# Altium footprint library 1.27插件排针.PcbLib: 49 footprints (part 3 of 4)
Each footprint in its own frame and in the unit in brackets; x right, y up, seen from the top. Pads: shape width x height; smd on the part's side, far side on the other; paste and mask are expansions set on the pad; w line width, h text height; cw(c..) or ccw(c..) is an arc to the next point about the centre after c.
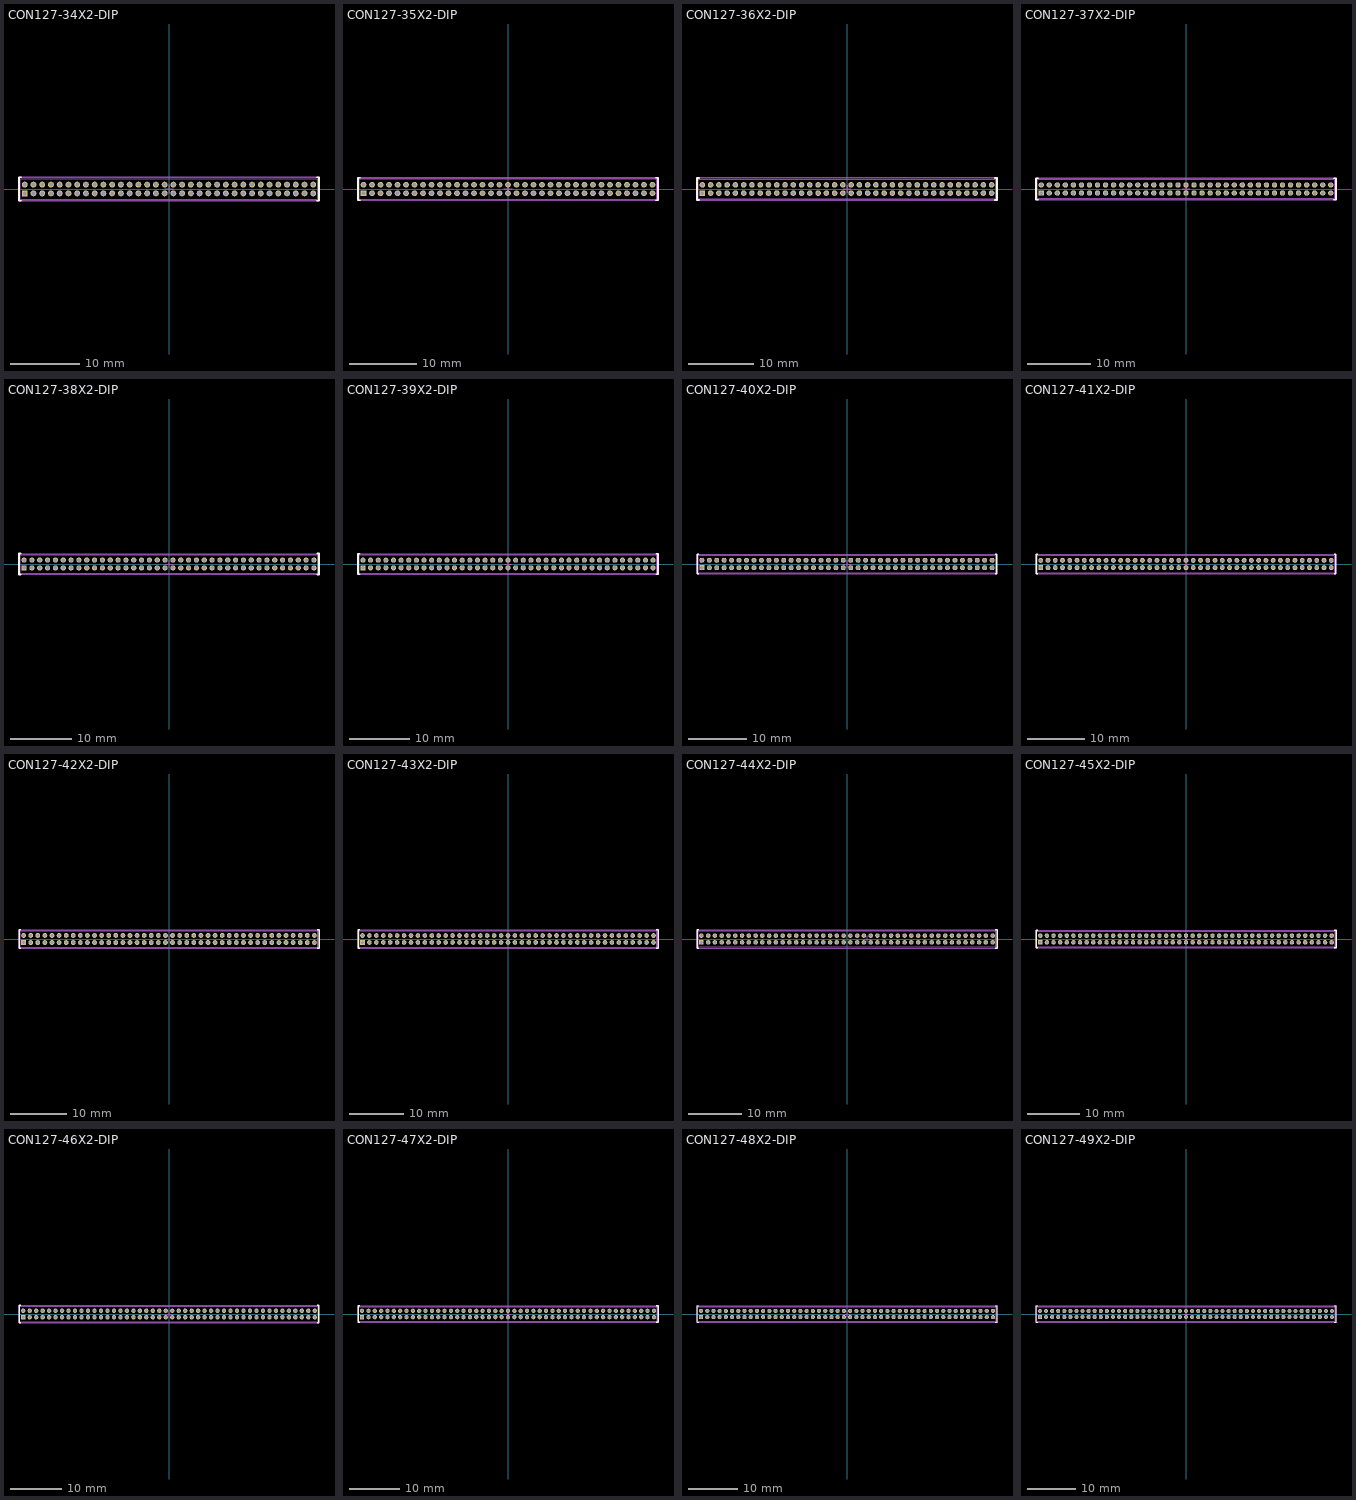
[diagram p2: the footprints below, top view; thin cyan lines are the x and y axes]

## CON127-34X2-DIP [mm] "1.27mm脚距34*2 双排针 -55°C to+105°C 450V AC"
height 3.5
pads (68):
  rect 0.85x0.85 hole 0.55 unplated: 1(-20.955,-0.635)
  round 0.85 hole 0.55 unplated: 2(-20.955,0.635) 3(-19.685,-0.635) 4(-19.685,0.635) 5(-18.415,-0.635) 6(-18.415,0.635) 7(-17.145,-0.635) 8(-17.145,0.635) 9(-15.875,-0.635) 10(-15.875,0.635) 11(-14.605,-0.635) 12(-14.605,0.635) 13(-13.335,-0.635) 14(-13.335,0.635) 15(-12.065,-0.635) 16(-12.065,0.635) 17(-10.795,-0.635) 18(-10.795,0.635) 19(-9.525,-0.635) 20(-9.525,0.635) 21(-8.255,-0.635) 22(-8.255,0.635) 23(-6.985,-0.635) 24(-6.985,0.635) 25(-5.715,-0.635) 26(-5.715,0.635) 27(-4.445,-0.635) 28(-4.445,0.635) 29(-3.175,-0.635) 30(-3.175,0.635) 31(-1.905,-0.635) 32(-1.905,0.635) 33(-0.635,-0.635) 34(-0.635,0.635) 35(0.635,-0.635) 36(0.635,0.635) 37(1.905,-0.635) 38(1.905,0.635) 39(3.175,-0.635) 40(3.175,0.635) 41(4.445,-0.635) 42(4.445,0.635) 43(5.715,-0.635) 44(5.715,0.635) 45(6.985,-0.635) 46(6.985,0.635) 47(8.255,-0.635) 48(8.255,0.635) 49(9.525,-0.635) 50(9.525,0.635) 51(10.795,-0.635) 52(10.795,0.635) 53(12.065,-0.635) 54(12.065,0.635) 55(13.335,-0.635) 56(13.335,0.635) 57(14.605,-0.635) 58(14.605,0.635) 59(15.875,-0.635) 60(15.875,0.635) 61(17.145,-0.635) 62(17.145,0.635) 63(18.415,-0.635) 64(18.415,0.635) 65(19.685,-0.635) 66(19.685,0.635) 67(20.955,-0.635) 68(20.955,0.635)
Top Overlay:
  lines w0.254: -21.463,-1.7 -21.78,-1.7 -21.78,1.7 -21.463,1.7 ; 21.463,-1.7 21.78,-1.7 21.78,1.7 21.463,1.7
Mechanical 13:
  lines w0.1: -21.59,-1.499 -21.59,1.501 ; -21.59,-1.499 21.59,-1.499 ; -21.59,-1.499 -21.59,1.501 ; -21.59,1.501 21.59,1.501 ; 21.59,-1.499 21.59,1.501 ; 21.59,-1.499 21.59,1.501
Mechanical 15:
  lines w0.2: -0.6,0 0.6,0 ; 0,-0.6 0,0.6 ; -21.78,-1.7 21.78,-1.7 21.78,1.7 -21.78,1.7 -21.78,-1.7
3D body: height 3.8, standoff -1.8, extent -21.59,-1.499 21.59,1.501

## CON127-35X2-DIP [mm] "1.27mm脚距35*2 双排针 -55°C to+105°C 450V AC"
height 3.5
pads (70):
  rect 0.85x0.85 hole 0.55 unplated: 1(-21.59,-0.635)
  round 0.85 hole 0.55 unplated: 2(-21.59,0.635) 3(-20.32,-0.635) 4(-20.32,0.635) 5(-19.05,-0.635) 6(-19.05,0.635) 7(-17.78,-0.635) 8(-17.78,0.635) 9(-16.51,-0.635) 10(-16.51,0.635) 11(-15.24,-0.635) 12(-15.24,0.635) 13(-13.97,-0.635) 14(-13.97,0.635) 15(-12.7,-0.635) 16(-12.7,0.635) 17(-11.43,-0.635) 18(-11.43,0.635) 19(-10.16,-0.635) 20(-10.16,0.635) 21(-8.89,-0.635) 22(-8.89,0.635) 23(-7.62,-0.635) 24(-7.62,0.635) 25(-6.35,-0.635) 26(-6.35,0.635) 27(-5.08,-0.635) 28(-5.08,0.635) 29(-3.81,-0.635) 30(-3.81,0.635) 31(-2.54,-0.635) 32(-2.54,0.635) 33(-1.27,-0.635) 34(-1.27,0.635) 35(0,-0.635) 36(0,0.635) 37(1.27,-0.635) 38(1.27,0.635) 39(2.54,-0.635) 40(2.54,0.635) 41(3.81,-0.635) 42(3.81,0.635) 43(5.08,-0.635) 44(5.08,0.635) 45(6.35,-0.635) 46(6.35,0.635) 47(7.62,-0.635) 48(7.62,0.635) 49(8.89,-0.635) 50(8.89,0.635) 51(10.16,-0.635) 52(10.16,0.635) 53(11.43,-0.635) 54(11.43,0.635) 55(12.7,-0.635) 56(12.7,0.635) 57(13.97,-0.635) 58(13.97,0.635) 59(15.24,-0.635) 60(15.24,0.635) 61(16.51,-0.635) 62(16.51,0.635) 63(17.78,-0.635) 64(17.78,0.635) 65(19.05,-0.635) 66(19.05,0.635) 67(20.32,-0.635) 68(20.32,0.635) 69(21.59,-0.635) 70(21.59,0.635)
Top Overlay:
  lines w0.254: -22.098,-1.7 -22.415,-1.7 -22.415,1.7 -22.098,1.7 ; 22.098,-1.7 22.415,-1.7 22.415,1.7 22.098,1.7
Mechanical 13:
  lines w0.1: -22.225,-1.499 -22.225,1.501 ; -22.225,-1.499 22.225,-1.499 ; -22.225,-1.499 -22.225,1.501 ; -22.225,1.501 22.225,1.501 ; 22.225,-1.499 22.225,1.501 ; 22.225,-1.499 22.225,1.501
Mechanical 15:
  lines w0.2: -0.6,0 0.6,0 ; 0,-0.6 0,0.6 ; -22.415,-1.7 -22.415,1.7 22.415,1.7 22.415,-1.7 -22.415,-1.7
3D body: height 3.8, standoff -1.8, extent -22.225,-1.499 22.225,1.501

## CON127-36X2-DIP [mm] "1.27mm脚距36*2 双排针 -55°C to+105°C 450V AC"
height 3.5
pads (72):
  rect 0.85x0.85 hole 0.55 unplated: 1(-22.225,-0.635)
  round 0.85 hole 0.55 unplated: 2(-22.225,0.635) 3(-20.955,-0.635) 4(-20.955,0.635) 5(-19.685,-0.635) 6(-19.685,0.635) 7(-18.415,-0.635) 8(-18.415,0.635) 9(-17.145,-0.635) 10(-17.145,0.635) 11(-15.875,-0.635) 12(-15.875,0.635) 13(-14.605,-0.635) 14(-14.605,0.635) 15(-13.335,-0.635) 16(-13.335,0.635) 17(-12.065,-0.635) 18(-12.065,0.635) 19(-10.795,-0.635) 20(-10.795,0.635) 21(-9.525,-0.635) 22(-9.525,0.635) 23(-8.255,-0.635) 24(-8.255,0.635) 25(-6.985,-0.635) 26(-6.985,0.635) 27(-5.715,-0.635) 28(-5.715,0.635) 29(-4.445,-0.635) 30(-4.445,0.635) 31(-3.175,-0.635) 32(-3.175,0.635) 33(-1.905,-0.635) 34(-1.905,0.635) 35(-0.635,-0.635) 36(-0.635,0.635) 37(0.635,-0.635) 38(0.635,0.635) 39(1.905,-0.635) 40(1.905,0.635) 41(3.175,-0.635) 42(3.175,0.635) 43(4.445,-0.635) 44(4.445,0.635) 45(5.715,-0.635) 46(5.715,0.635) 47(6.985,-0.635) 48(6.985,0.635) 49(8.255,-0.635) 50(8.255,0.635) 51(9.525,-0.635) 52(9.525,0.635) 53(10.795,-0.635) 54(10.795,0.635) 55(12.065,-0.635) 56(12.065,0.635) 57(13.335,-0.635) 58(13.335,0.635) 59(14.605,-0.635) 60(14.605,0.635) 61(15.875,-0.635) 62(15.875,0.635) 63(17.145,-0.635) 64(17.145,0.635) 65(18.415,-0.635) 66(18.415,0.635) 67(19.685,-0.635) 68(19.685,0.635) 69(20.955,-0.635) 70(20.955,0.635) 71(22.225,-0.635) 72(22.225,0.635)
Top Overlay:
  lines w0.254: -22.733,-1.7 -23.05,-1.7 -23.05,1.7 -22.733,1.7 ; 22.733,-1.7 23.05,-1.7 23.05,1.7 22.733,1.7
Mechanical 13:
  lines w0.1: -22.86,-1.499 22.86,-1.499 ; -22.86,-1.499 -22.86,1.501 ; -22.86,-1.499 -22.86,1.501 ; -22.86,1.501 22.86,1.501 ; 22.86,-1.499 22.86,1.501 ; 22.86,-1.499 22.86,1.501
Mechanical 15:
  lines w0.2: -0.6,0 0.6,0 ; 0,-0.6 0,0.6 ; -23.05,-1.7 23.05,-1.7 23.05,1.7 -23.05,1.7 -23.05,-1.7
3D body: height 3.8, standoff -1.8, extent -22.86,-1.499 22.86,1.501

## CON127-37X2-DIP [mm] "1.27mm脚距37*2 双排针 -55°C to+105°C 450V AC"
height 3.5
pads (74):
  rect 0.85x0.85 hole 0.55 unplated: 1(-22.86,-0.635)
  round 0.85 hole 0.55 unplated: 2(-22.86,0.635) 3(-21.59,-0.635) 4(-21.59,0.635) 5(-20.32,-0.635) 6(-20.32,0.635) 7(-19.05,-0.635) 8(-19.05,0.635) 9(-17.78,-0.635) 10(-17.78,0.635) 11(-16.51,-0.635) 12(-16.51,0.635) 13(-15.24,-0.635) 14(-15.24,0.635) 15(-13.97,-0.635) 16(-13.97,0.635) 17(-12.7,-0.635) 18(-12.7,0.635) 19(-11.43,-0.635) 20(-11.43,0.635) 21(-10.16,-0.635) 22(-10.16,0.635) 23(-8.89,-0.635) 24(-8.89,0.635) 25(-7.62,-0.635) 26(-7.62,0.635) 27(-6.35,-0.635) 28(-6.35,0.635) 29(-5.08,-0.635) 30(-5.08,0.635) 31(-3.81,-0.635) 32(-3.81,0.635) 33(-2.54,-0.635) 34(-2.54,0.635) 35(-1.27,-0.635) 36(-1.27,0.635) 37(0,-0.635) 38(0,0.635) 39(1.27,-0.635) 40(1.27,0.635) 41(2.54,-0.635) 42(2.54,0.635) 43(3.81,-0.635) 44(3.81,0.635) 45(5.08,-0.635) 46(5.08,0.635) 47(6.35,-0.635) 48(6.35,0.635) 49(7.62,-0.635) 50(7.62,0.635) 51(8.89,-0.635) 52(8.89,0.635) 53(10.16,-0.635) 54(10.16,0.635) 55(11.43,-0.635) 56(11.43,0.635) 57(12.7,-0.635) 58(12.7,0.635) 59(13.97,-0.635) 60(13.97,0.635) 61(15.24,-0.635) 62(15.24,0.635) 63(16.51,-0.635) 64(16.51,0.635) 65(17.78,-0.635) 66(17.78,0.635) 67(19.05,-0.635) 68(19.05,0.635) 69(20.32,-0.635) 70(20.32,0.635) 71(21.59,-0.635) 72(21.59,0.635) 73(22.86,-0.635) 74(22.86,0.635)
Top Overlay:
  lines w0.254: -23.368,-1.7 -23.685,-1.7 -23.685,1.7 -23.368,1.7 ; 23.368,-1.7 23.685,-1.7 23.685,1.7 23.368,1.7
Mechanical 13:
  lines w0.1: -23.495,-1.499 23.495,-1.499 ; -23.495,-1.499 -23.495,1.501 ; -23.495,-1.499 -23.495,1.501 ; -23.495,1.501 23.495,1.501 ; 23.495,-1.499 23.495,1.501 ; 23.495,-1.499 23.495,1.501
Mechanical 15:
  lines w0.2: -0.6,0 0.6,0 ; 0,-0.6 0,0.6 ; -23.685,-1.7 23.685,-1.7 23.685,1.7 -23.685,1.7 -23.685,-1.7
3D body: height 3.8, standoff -1.8, extent -23.495,-1.499 23.495,1.501

## CON127-38X2-DIP [mm] "1.27mm脚距38*2 双排针 -55°C to+105°C 450V AC"
height 3.5
pads (76):
  rect 0.85x0.85 hole 0.55 unplated: 1(-23.495,-0.635)
  round 0.85 hole 0.55 unplated: 2(-23.495,0.635) 3(-22.225,-0.635) 4(-22.225,0.635) 5(-20.955,-0.635) 6(-20.955,0.635) 7(-19.685,-0.635) 8(-19.685,0.635) 9(-18.415,-0.635) 10(-18.415,0.635) 11(-17.145,-0.635) 12(-17.145,0.635) 13(-15.875,-0.635) 14(-15.875,0.635) 15(-14.605,-0.635) 16(-14.605,0.635) 17(-13.335,-0.635) 18(-13.335,0.635) 19(-12.065,-0.635) 20(-12.065,0.635) 21(-10.795,-0.635) 22(-10.795,0.635) 23(-9.525,-0.635) 24(-9.525,0.635) 25(-8.255,-0.635) 26(-8.255,0.635) 27(-6.985,-0.635) 28(-6.985,0.635) 29(-5.715,-0.635) 30(-5.715,0.635) 31(-4.445,-0.635) 32(-4.445,0.635) 33(-3.175,-0.635) 34(-3.175,0.635) 35(-1.905,-0.635) 36(-1.905,0.635) 37(-0.635,-0.635) 38(-0.635,0.635) 39(0.635,-0.635) 40(0.635,0.635) 41(1.905,-0.635) 42(1.905,0.635) 43(3.175,-0.635) 44(3.175,0.635) 45(4.445,-0.635) 46(4.445,0.635) 47(5.715,-0.635) 48(5.715,0.635) 49(6.985,-0.635) 50(6.985,0.635) 51(8.255,-0.635) 52(8.255,0.635) 53(9.525,-0.635) 54(9.525,0.635) 55(10.795,-0.635) 56(10.795,0.635) 57(12.065,-0.635) 58(12.065,0.635) 59(13.335,-0.635) 60(13.335,0.635) 61(14.605,-0.635) 62(14.605,0.635) 63(15.875,-0.635) 64(15.875,0.635) 65(17.145,-0.635) 66(17.145,0.635) 67(18.415,-0.635) 68(18.415,0.635) 69(19.685,-0.635) 70(19.685,0.635) 71(20.955,-0.635) 72(20.955,0.635) 73(22.225,-0.635) 74(22.225,0.635) 75(23.495,-0.635) 76(23.495,0.635)
Top Overlay:
  lines w0.254: -24.003,-1.7 -24.32,-1.7 -24.32,1.7 -24.003,1.7 ; 24.003,-1.7 24.32,-1.7 24.32,1.7 24.003,1.7
Mechanical 13:
  lines w0.1: -24.13,-1.499 -24.13,1.501 ; -24.13,-1.499 24.13,-1.499 ; -24.13,-1.499 -24.13,1.501 ; -24.13,1.501 24.13,1.501 ; 24.13,-1.499 24.13,1.501 ; 24.13,-1.499 24.13,1.501
Mechanical 15:
  lines w0.2: -0.6,0 0.6,0 ; 0,-0.6 0,0.6 ; -24.32,-1.7 -24.32,1.7 24.32,1.7 24.32,-1.7 -24.32,-1.7
3D body: height 3.8, standoff -1.8, extent -24.13,-1.499 24.13,1.501

## CON127-39X2-DIP [mm] "1.27mm脚距39*2 双排针 -55°C to+105°C 450V AC"
height 3.5
pads (78):
  rect 0.85x0.85 hole 0.55 unplated: 1(-24.13,-0.635)
  round 0.85 hole 0.55 unplated: 2(-24.13,0.635) 3(-22.86,-0.635) 4(-22.86,0.635) 5(-21.59,-0.635) 6(-21.59,0.635) 7(-20.32,-0.635) 8(-20.32,0.635) 9(-19.05,-0.635) 10(-19.05,0.635) 11(-17.78,-0.635) 12(-17.78,0.635) 13(-16.51,-0.635) 14(-16.51,0.635) 15(-15.24,-0.635) 16(-15.24,0.635) 17(-13.97,-0.635) 18(-13.97,0.635) 19(-12.7,-0.635) 20(-12.7,0.635) 21(-11.43,-0.635) 22(-11.43,0.635) 23(-10.16,-0.635) 24(-10.16,0.635) 25(-8.89,-0.635) 26(-8.89,0.635) 27(-7.62,-0.635) 28(-7.62,0.635) 29(-6.35,-0.635) 30(-6.35,0.635) 31(-5.08,-0.635) 32(-5.08,0.635) 33(-3.81,-0.635) 34(-3.81,0.635) 35(-2.54,-0.635) 36(-2.54,0.635) 37(-1.27,-0.635) 38(-1.27,0.635) 39(0,-0.635) 40(0,0.635) 41(1.27,-0.635) 42(1.27,0.635) 43(2.54,-0.635) 44(2.54,0.635) 45(3.81,-0.635) 46(3.81,0.635) 47(5.08,-0.635) 48(5.08,0.635) 49(6.35,-0.635) 50(6.35,0.635) 51(7.62,-0.635) 52(7.62,0.635) 53(8.89,-0.635) 54(8.89,0.635) 55(10.16,-0.635) 56(10.16,0.635) 57(11.43,-0.635) 58(11.43,0.635) 59(12.7,-0.635) 60(12.7,0.635) 61(13.97,-0.635) 62(13.97,0.635) 63(15.24,-0.635) 64(15.24,0.635) 65(16.51,-0.635) 66(16.51,0.635) 67(17.78,-0.635) 68(17.78,0.635) 69(19.05,-0.635) 70(19.05,0.635) 71(20.32,-0.635) 72(20.32,0.635) 73(21.59,-0.635) 74(21.59,0.635) 75(22.86,-0.635) 76(22.86,0.635) 77(24.13,-0.635) 78(24.13,0.635)
Top Overlay:
  lines w0.254: -24.638,-1.7 -24.955,-1.7 -24.955,1.7 -24.638,1.7 ; 24.638,-1.7 24.955,-1.7 24.955,1.7 24.638,1.7
Mechanical 13:
  lines w0.1: -24.765,-1.499 24.765,-1.499 ; -24.765,-1.499 -24.765,1.501 ; -24.765,-1.499 -24.765,1.501 ; -24.765,1.501 24.765,1.501 ; 24.765,-1.499 24.765,1.501 ; 24.765,-1.499 24.765,1.501
Mechanical 15:
  lines w0.2: -0.6,0 0.6,0 ; 0,-0.6 0,0.6 ; -24.955,-1.7 24.955,-1.7 24.955,1.7 -24.955,1.7 -24.955,-1.7
3D body: height 3.8, standoff -1.8, extent -24.765,-1.499 24.765,1.501

## CON127-40X2-DIP [mm] "1.27mm脚距40*2 双排针 -55°C to+105°C 450V AC"
height 3.5
pads (80):
  rect 0.85x0.85 hole 0.55 unplated: 1(-24.765,-0.635)
  round 0.85 hole 0.55 unplated: 2(-24.765,0.635) 3(-23.495,-0.635) 4(-23.495,0.635) 5(-22.225,-0.635) 6(-22.225,0.635) 7(-20.955,-0.635) 8(-20.955,0.635) 9(-19.685,-0.635) 10(-19.685,0.635) 11(-18.415,-0.635) 12(-18.415,0.635) 13(-17.145,-0.635) 14(-17.145,0.635) 15(-15.875,-0.635) 16(-15.875,0.635) 17(-14.605,-0.635) 18(-14.605,0.635) 19(-13.335,-0.635) 20(-13.335,0.635) 21(-12.065,-0.635) 22(-12.065,0.635) 23(-10.795,-0.635) 24(-10.795,0.635) 25(-9.525,-0.635) 26(-9.525,0.635) 27(-8.255,-0.635) 28(-8.255,0.635) 29(-6.985,-0.635) 30(-6.985,0.635) 31(-5.715,-0.635) 32(-5.715,0.635) 33(-4.445,-0.635) 34(-4.445,0.635) 35(-3.175,-0.635) 36(-3.175,0.635) 37(-1.905,-0.635) 38(-1.905,0.635) 39(-0.635,-0.635) 40(-0.635,0.635) 41(0.635,-0.635) 42(0.635,0.635) 43(1.905,-0.635) 44(1.905,0.635) 45(3.175,-0.635) 46(3.175,0.635) 47(4.445,-0.635) 48(4.445,0.635) 49(5.715,-0.635) 50(5.715,0.635) 51(6.985,-0.635) 52(6.985,0.635) 53(8.255,-0.635) 54(8.255,0.635) 55(9.525,-0.635) 56(9.525,0.635) 57(10.795,-0.635) 58(10.795,0.635) 59(12.065,-0.635) 60(12.065,0.635) 61(13.335,-0.635) 62(13.335,0.635) 63(14.605,-0.635) 64(14.605,0.635) 65(15.875,-0.635) 66(15.875,0.635) 67(17.145,-0.635) 68(17.145,0.635) 69(18.415,-0.635) 70(18.415,0.635) 71(19.685,-0.635) 72(19.685,0.635) 73(20.955,-0.635) 74(20.955,0.635) 75(22.225,-0.635) 76(22.225,0.635) 77(23.495,-0.635) 78(23.495,0.635) 79(24.765,-0.635) 80(24.765,0.635)
Top Overlay:
  lines w0.254: -25.273,-1.7 -25.59,-1.7 -25.59,1.7 -25.273,1.7 ; 25.273,-1.7 25.59,-1.7 25.59,1.7 25.273,1.7
Mechanical 13:
  lines w0.1: -25.4,-1.499 25.4,-1.499 ; -25.4,-1.499 -25.4,1.501 ; -25.4,-1.499 -25.4,1.501 ; -25.4,1.501 25.4,1.501 ; 25.4,-1.499 25.4,1.501 ; 25.4,-1.499 25.4,1.501
Mechanical 15:
  lines w0.2: -0.6,0 0.6,0 ; 0,-0.6 0,0.6 ; -25.59,-1.7 25.59,-1.7 25.59,1.7 -25.59,1.7 -25.59,-1.7
3D body: height 3.8, standoff -1.8, extent -25.4,-1.499 25.4,1.501

## CON127-41X2-DIP [mm] "1.27mm脚距41*2 双排针 -55°C to+105°C 450V AC"
height 3.5
pads (82):
  rect 0.85x0.85 hole 0.55 unplated: 1(-25.4,-0.635)
  round 0.85 hole 0.55 unplated: 2(-25.4,0.635) 3(-24.13,-0.635) 4(-24.13,0.635) 5(-22.86,-0.635) 6(-22.86,0.635) 7(-21.59,-0.635) 8(-21.59,0.635) 9(-20.32,-0.635) 10(-20.32,0.635) 11(-19.05,-0.635) 12(-19.05,0.635) 13(-17.78,-0.635) 14(-17.78,0.635) 15(-16.51,-0.635) 16(-16.51,0.635) 17(-15.24,-0.635) 18(-15.24,0.635) 19(-13.97,-0.635) 20(-13.97,0.635) 21(-12.7,-0.635) 22(-12.7,0.635) 23(-11.43,-0.635) 24(-11.43,0.635) 25(-10.16,-0.635) 26(-10.16,0.635) 27(-8.89,-0.635) 28(-8.89,0.635) 29(-7.62,-0.635) 30(-7.62,0.635) 31(-6.35,-0.635) 32(-6.35,0.635) 33(-5.08,-0.635) 34(-5.08,0.635) 35(-3.81,-0.635) 36(-3.81,0.635) 37(-2.54,-0.635) 38(-2.54,0.635) 39(-1.27,-0.635) 40(-1.27,0.635) 41(0,-0.635) 42(0,0.635) 43(1.27,-0.635) 44(1.27,0.635) 45(2.54,-0.635) 46(2.54,0.635) 47(3.81,-0.635) 48(3.81,0.635) 49(5.08,-0.635) 50(5.08,0.635) 51(6.35,-0.635) 52(6.35,0.635) 53(7.62,-0.635) 54(7.62,0.635) 55(8.89,-0.635) 56(8.89,0.635) 57(10.16,-0.635) 58(10.16,0.635) 59(11.43,-0.635) 60(11.43,0.635) 61(12.7,-0.635) 62(12.7,0.635) 63(13.97,-0.635) 64(13.97,0.635) 65(15.24,-0.635) 66(15.24,0.635) 67(16.51,-0.635) 68(16.51,0.635) 69(17.78,-0.635) 70(17.78,0.635) 71(19.05,-0.635) 72(19.05,0.635) 73(20.32,-0.635) 74(20.32,0.635) 75(21.59,-0.635) 76(21.59,0.635) 77(22.86,-0.635) 78(22.86,0.635) 79(24.13,-0.635) 80(24.13,0.635) 81(25.4,-0.635) 82(25.4,0.635)
Top Overlay:
  lines w0.254: -25.908,-1.7 -26.225,-1.7 -26.225,1.7 -25.908,1.7 ; 25.908,-1.7 26.225,-1.7 26.225,1.7 25.908,1.7
Mechanical 13:
  lines w0.1: -26.035,-1.499 -26.035,1.501 ; -26.035,-1.499 26.035,-1.499 ; -26.035,-1.499 -26.035,1.501 ; -26.035,1.501 26.035,1.501 ; 26.035,-1.499 26.035,1.501 ; 26.035,-1.499 26.035,1.501
Mechanical 15:
  lines w0.2: -0.6,0 0.6,0 ; 0,-0.6 0,0.6 ; -26.225,-1.7 -26.225,1.7 26.225,1.7 26.225,-1.7 -26.225,-1.7
3D body: height 3.8, standoff -1.8, extent -26.035,-1.499 26.035,1.501

## CON127-42X2-DIP [mm] "1.27mm脚距42*2 双排针 -55°C to+105°C 450V AC"
height 3.5
pads (84):
  rect 0.85x0.85 hole 0.55 unplated: 1(-26.035,-0.635)
  round 0.85 hole 0.55 unplated: 2(-26.035,0.635) 3(-24.765,-0.635) 4(-24.765,0.635) 5(-23.495,-0.635) 6(-23.495,0.635) 7(-22.225,-0.635) 8(-22.225,0.635) 9(-20.955,-0.635) 10(-20.955,0.635) 11(-19.685,-0.635) 12(-19.685,0.635) 13(-18.415,-0.635) 14(-18.415,0.635) 15(-17.145,-0.635) 16(-17.145,0.635) 17(-15.875,-0.635) 18(-15.875,0.635) 19(-14.605,-0.635) 20(-14.605,0.635) 21(-13.335,-0.635) 22(-13.335,0.635) 23(-12.065,-0.635) 24(-12.065,0.635) 25(-10.795,-0.635) 26(-10.795,0.635) 27(-9.525,-0.635) 28(-9.525,0.635) 29(-8.255,-0.635) 30(-8.255,0.635) 31(-6.985,-0.635) 32(-6.985,0.635) 33(-5.715,-0.635) 34(-5.715,0.635) 35(-4.445,-0.635) 36(-4.445,0.635) 37(-3.175,-0.635) 38(-3.175,0.635) 39(-1.905,-0.635) 40(-1.905,0.635) 41(-0.635,-0.635) 42(-0.635,0.635) 43(0.635,-0.635) 44(0.635,0.635) 45(1.905,-0.635) 46(1.905,0.635) 47(3.175,-0.635) 48(3.175,0.635) 49(4.445,-0.635) 50(4.445,0.635) 51(5.715,-0.635) 52(5.715,0.635) 53(6.985,-0.635) 54(6.985,0.635) 55(8.255,-0.635) 56(8.255,0.635) 57(9.525,-0.635) 58(9.525,0.635) 59(10.795,-0.635) 60(10.795,0.635) 61(12.065,-0.635) 62(12.065,0.635) 63(13.335,-0.635) 64(13.335,0.635) 65(14.605,-0.635) 66(14.605,0.635) 67(15.875,-0.635) 68(15.875,0.635) 69(17.145,-0.635) 70(17.145,0.635) 71(18.415,-0.635) 72(18.415,0.635) 73(19.685,-0.635) 74(19.685,0.635) 75(20.955,-0.635) 76(20.955,0.635) 77(22.225,-0.635) 78(22.225,0.635) 79(23.495,-0.635) 80(23.495,0.635) 81(24.765,-0.635) 82(24.765,0.635) 83(26.035,-0.635) 84(26.035,0.635)
Top Overlay:
  lines w0.254: -26.543,-1.7 -26.86,-1.7 -26.86,1.7 -26.543,1.7 ; 26.543,-1.7 26.86,-1.7 26.86,1.7 26.543,1.7
Mechanical 13:
  lines w0.1: -26.67,-1.499 26.67,-1.499 ; -26.67,-1.499 -26.67,1.501 ; -26.67,-1.499 -26.67,1.501 ; -26.67,1.501 26.67,1.501 ; 26.67,-1.499 26.67,1.501 ; 26.67,-1.499 26.67,1.501
Mechanical 15:
  lines w0.2: -0.6,0 0.6,0 ; 0,-0.6 0,0.6 ; -26.86,-1.7 26.86,-1.7 26.86,1.7 -26.86,1.7 -26.86,-1.7
3D body: height 3.8, standoff -1.8, extent -26.67,-1.499 26.67,1.501

## CON127-43X2-DIP [mm] "1.27mm脚距43*2 双排针 -55°C to+105°C 450V AC"
height 3.5
pads (86):
  rect 0.85x0.85 hole 0.55 unplated: 1(-26.67,-0.635)
  round 0.85 hole 0.55 unplated: 2(-26.67,0.635) 3(-25.4,-0.635) 4(-25.4,0.635) 5(-24.13,-0.635) 6(-24.13,0.635) 7(-22.86,-0.635) 8(-22.86,0.635) 9(-21.59,-0.635) 10(-21.59,0.635) 11(-20.32,-0.635) 12(-20.32,0.635) 13(-19.05,-0.635) 14(-19.05,0.635) 15(-17.78,-0.635) 16(-17.78,0.635) 17(-16.51,-0.635) 18(-16.51,0.635) 19(-15.24,-0.635) 20(-15.24,0.635) 21(-13.97,-0.635) 22(-13.97,0.635) 23(-12.7,-0.635) 24(-12.7,0.635) 25(-11.43,-0.635) 26(-11.43,0.635) 27(-10.16,-0.635) 28(-10.16,0.635) 29(-8.89,-0.635) 30(-8.89,0.635) 31(-7.62,-0.635) 32(-7.62,0.635) 33(-6.35,-0.635) 34(-6.35,0.635) 35(-5.08,-0.635) 36(-5.08,0.635) 37(-3.81,-0.635) 38(-3.81,0.635) 39(-2.54,-0.635) 40(-2.54,0.635) 41(-1.27,-0.635) 42(-1.27,0.635) 43(0,-0.635) 44(0,0.635) 45(1.27,-0.635) 46(1.27,0.635) 47(2.54,-0.635) 48(2.54,0.635) 49(3.81,-0.635) 50(3.81,0.635) 51(5.08,-0.635) 52(5.08,0.635) 53(6.35,-0.635) 54(6.35,0.635) 55(7.62,-0.635) 56(7.62,0.635) 57(8.89,-0.635) 58(8.89,0.635) 59(10.16,-0.635) 60(10.16,0.635) 61(11.43,-0.635) 62(11.43,0.635) 63(12.7,-0.635) 64(12.7,0.635) 65(13.97,-0.635) 66(13.97,0.635) 67(15.24,-0.635) 68(15.24,0.635) 69(16.51,-0.635) 70(16.51,0.635) 71(17.78,-0.635) 72(17.78,0.635) 73(19.05,-0.635) 74(19.05,0.635) 75(20.32,-0.635) 76(20.32,0.635) 77(21.59,-0.635) 78(21.59,0.635) 79(22.86,-0.635) 80(22.86,0.635) 81(24.13,-0.635) 82(24.13,0.635) 83(25.4,-0.635) 84(25.4,0.635) 85(26.67,-0.635) 86(26.67,0.635)
Top Overlay:
  lines w0.254: -27.178,-1.7 -27.495,-1.7 -27.495,1.7 -27.178,1.7 ; 27.178,-1.7 27.495,-1.7 27.495,1.7 27.178,1.7
Mechanical 13:
  lines w0.1: -27.305,-1.499 -27.305,1.501 ; -27.305,-1.499 -27.305,1.501 ; -27.305,-1.499 27.305,-1.499 ; -27.305,1.501 27.305,1.501 ; 27.305,-1.499 27.305,1.501 ; 27.305,-1.499 27.305,1.501
Mechanical 15:
  lines w0.2: -0.6,0 0.6,0 ; 0,-0.6 0,0.6 ; -27.495,-1.7 -27.495,1.7 27.495,1.7 27.495,-1.7 -27.495,-1.7
3D body: height 3.8, standoff -1.8, extent -27.305,-1.499 27.305,1.501

## CON127-44X2-DIP [mm] "1.27mm脚距44*2 双排针 -55°C to+105°C 450V AC"
height 3.5
pads (88):
  rect 0.85x0.85 hole 0.55 unplated: 1(-27.305,-0.635)
  round 0.85 hole 0.55 unplated: 2(-27.305,0.635) 3(-26.035,-0.635) 4(-26.035,0.635) 5(-24.765,-0.635) 6(-24.765,0.635) 7(-23.495,-0.635) 8(-23.495,0.635) 9(-22.225,-0.635) 10(-22.225,0.635) 11(-20.955,-0.635) 12(-20.955,0.635) 13(-19.685,-0.635) 14(-19.685,0.635) 15(-18.415,-0.635) 16(-18.415,0.635) 17(-17.145,-0.635) 18(-17.145,0.635) 19(-15.875,-0.635) 20(-15.875,0.635) 21(-14.605,-0.635) 22(-14.605,0.635) 23(-13.335,-0.635) 24(-13.335,0.635) 25(-12.065,-0.635) 26(-12.065,0.635) 27(-10.795,-0.635) 28(-10.795,0.635) 29(-9.525,-0.635) 30(-9.525,0.635) 31(-8.255,-0.635) 32(-8.255,0.635) 33(-6.985,-0.635) 34(-6.985,0.635) 35(-5.715,-0.635) 36(-5.715,0.635) 37(-4.445,-0.635) 38(-4.445,0.635) 39(-3.175,-0.635) 40(-3.175,0.635) 41(-1.905,-0.635) 42(-1.905,0.635) 43(-0.635,-0.635) 44(-0.635,0.635) 45(0.635,-0.635) 46(0.635,0.635) 47(1.905,-0.635) 48(1.905,0.635) 49(3.175,-0.635) 50(3.175,0.635) 51(4.445,-0.635) 52(4.445,0.635) 53(5.715,-0.635) 54(5.715,0.635) 55(6.985,-0.635) 56(6.985,0.635) 57(8.255,-0.635) 58(8.255,0.635) 59(9.525,-0.635) 60(9.525,0.635) 61(10.795,-0.635) 62(10.795,0.635) 63(12.065,-0.635) 64(12.065,0.635) 65(13.335,-0.635) 66(13.335,0.635) 67(14.605,-0.635) 68(14.605,0.635) 69(15.875,-0.635) 70(15.875,0.635) 71(17.145,-0.635) 72(17.145,0.635) 73(18.415,-0.635) 74(18.415,0.635) 75(19.685,-0.635) 76(19.685,0.635) 77(20.955,-0.635) 78(20.955,0.635) 79(22.225,-0.635) 80(22.225,0.635) 81(23.495,-0.635) 82(23.495,0.635) 83(24.765,-0.635) 84(24.765,0.635) 85(26.035,-0.635) 86(26.035,0.635) 87(27.305,-0.635) 88(27.305,0.635)
Top Overlay:
  lines w0.254: -27.813,-1.7 -28.13,-1.7 -28.13,1.7 -27.813,1.7 ; 27.813,-1.7 28.13,-1.7 28.13,1.7 27.813,1.7
Mechanical 13:
  lines w0.1: -27.94,-1.499 27.94,-1.499 ; -27.94,-1.499 -27.94,1.501 ; -27.94,-1.499 -27.94,1.501 ; -27.94,1.501 27.94,1.501 ; 27.94,-1.499 27.94,1.501 ; 27.94,-1.499 27.94,1.501
Mechanical 15:
  lines w0.2: 3.21,0 4.41,0 ; 3.81,-0.6 3.81,0.6 ; -28.13,-1.7 28.13,-1.7 28.13,1.7 -28.13,1.7 -28.13,-1.7
3D body: height 3.8, standoff -1.8, extent -27.94,-1.499 27.94,1.501

## CON127-45X2-DIP [mm] "1.27mm脚距45*2 双排针 -55°C to+105°C 450V AC"
height 3.5
pads (90):
  rect 0.85x0.85 hole 0.55 unplated: 1(-27.94,-0.635)
  round 0.85 hole 0.55 unplated: 2(-27.94,0.635) 3(-26.67,-0.635) 4(-26.67,0.635) 5(-25.4,-0.635) 6(-25.4,0.635) 7(-24.13,-0.635) 8(-24.13,0.635) 9(-22.86,-0.635) 10(-22.86,0.635) 11(-21.59,-0.635) 12(-21.59,0.635) 13(-20.32,-0.635) 14(-20.32,0.635) 15(-19.05,-0.635) 16(-19.05,0.635) 17(-17.78,-0.635) 18(-17.78,0.635) 19(-16.51,-0.635) 20(-16.51,0.635) 21(-15.24,-0.635) 22(-15.24,0.635) 23(-13.97,-0.635) 24(-13.97,0.635) 25(-12.7,-0.635) 26(-12.7,0.635) 27(-11.43,-0.635) 28(-11.43,0.635) 29(-10.16,-0.635) 30(-10.16,0.635) 31(-8.89,-0.635) 32(-8.89,0.635) 33(-7.62,-0.635) 34(-7.62,0.635) 35(-6.35,-0.635) 36(-6.35,0.635) 37(-5.08,-0.635) 38(-5.08,0.635) 39(-3.81,-0.635) 40(-3.81,0.635) 41(-2.54,-0.635) 42(-2.54,0.635) 43(-1.27,-0.635) 44(-1.27,0.635) 45(0,-0.635) 46(0,0.635) 47(1.27,-0.635) 48(1.27,0.635) 49(2.54,-0.635) 50(2.54,0.635) 51(3.81,-0.635) 52(3.81,0.635) 53(5.08,-0.635) 54(5.08,0.635) 55(6.35,-0.635) 56(6.35,0.635) 57(7.62,-0.635) 58(7.62,0.635) 59(8.89,-0.635) 60(8.89,0.635) 61(10.16,-0.635) 62(10.16,0.635) 63(11.43,-0.635) 64(11.43,0.635) 65(12.7,-0.635) 66(12.7,0.635) 67(13.97,-0.635) 68(13.97,0.635) 69(15.24,-0.635) 70(15.24,0.635) 71(16.51,-0.635) 72(16.51,0.635) 73(17.78,-0.635) 74(17.78,0.635) 75(19.05,-0.635) 76(19.05,0.635) 77(20.32,-0.635) 78(20.32,0.635) 79(21.59,-0.635) 80(21.59,0.635) 81(22.86,-0.635) 82(22.86,0.635) 83(24.13,-0.635) 84(24.13,0.635) 85(25.4,-0.635) 86(25.4,0.635) 87(26.67,-0.635) 88(26.67,0.635) 89(27.94,-0.635) 90(27.94,0.635)
Top Overlay:
  lines w0.254: -28.448,-1.7 -28.765,-1.7 -28.765,1.7 -28.448,1.7 ; 28.448,-1.7 28.765,-1.7 28.765,1.7 28.448,1.7
Mechanical 13:
  lines w0.1: -28.575,-1.499 28.575,-1.499 ; -28.575,-1.499 -28.575,1.501 ; -28.575,-1.499 -28.575,1.501 ; -28.575,1.501 28.575,1.501 ; 28.575,-1.499 28.575,1.501 ; 28.575,-1.499 28.575,1.501
Mechanical 15:
  lines w0.2: -0.6,0 0.6,0 ; 0,-0.6 0,0.6 ; -28.765,-1.7 28.765,-1.7 28.765,1.7 -28.765,1.7 -28.765,-1.7
3D body: height 3.8, standoff -1.8, extent -28.575,-1.499 28.575,1.501

## CON127-46X2-DIP [mm] "1.27mm脚距46*2 双排针 -55°C to+105°C 450V AC"
height 3.5
pads (92):
  rect 0.85x0.85 hole 0.55 unplated: 1(-28.575,-0.635)
  round 0.85 hole 0.55 unplated: 2(-28.575,0.635) 3(-27.305,-0.635) 4(-27.305,0.635) 5(-26.035,-0.635) 6(-26.035,0.635) 7(-24.765,-0.635) 8(-24.765,0.635) 9(-23.495,-0.635) 10(-23.495,0.635) 11(-22.225,-0.635) 12(-22.225,0.635) 13(-20.955,-0.635) 14(-20.955,0.635) 15(-19.685,-0.635) 16(-19.685,0.635) 17(-18.415,-0.635) 18(-18.415,0.635) 19(-17.145,-0.635) 20(-17.145,0.635) 21(-15.875,-0.635) 22(-15.875,0.635) 23(-14.605,-0.635) 24(-14.605,0.635) 25(-13.335,-0.635) 26(-13.335,0.635) 27(-12.065,-0.635) 28(-12.065,0.635) 29(-10.795,-0.635) 30(-10.795,0.635) 31(-9.525,-0.635) 32(-9.525,0.635) 33(-8.255,-0.635) 34(-8.255,0.635) 35(-6.985,-0.635) 36(-6.985,0.635) 37(-5.715,-0.635) 38(-5.715,0.635) 39(-4.445,-0.635) 40(-4.445,0.635) 41(-3.175,-0.635) 42(-3.175,0.635) 43(-1.905,-0.635) 44(-1.905,0.635) 45(-0.635,-0.635) 46(-0.635,0.635) 47(0.635,-0.635) 48(0.635,0.635) 49(1.905,-0.635) 50(1.905,0.635) 51(3.175,-0.635) 52(3.175,0.635) 53(4.445,-0.635) 54(4.445,0.635) 55(5.715,-0.635) 56(5.715,0.635) 57(6.985,-0.635) 58(6.985,0.635) 59(8.255,-0.635) 60(8.255,0.635) 61(9.525,-0.635) 62(9.525,0.635) 63(10.795,-0.635) 64(10.795,0.635) 65(12.065,-0.635) 66(12.065,0.635) 67(13.335,-0.635) 68(13.335,0.635) 69(14.605,-0.635) 70(14.605,0.635) 71(15.875,-0.635) 72(15.875,0.635) 73(17.145,-0.635) 74(17.145,0.635) 75(18.415,-0.635) 76(18.415,0.635) 77(19.685,-0.635) 78(19.685,0.635) 79(20.955,-0.635) 80(20.955,0.635) 81(22.225,-0.635) 82(22.225,0.635) 83(23.495,-0.635) 84(23.495,0.635) 85(24.765,-0.635) 86(24.765,0.635) 87(26.035,-0.635) 88(26.035,0.635) 89(27.305,-0.635) 90(27.305,0.635) 91(28.575,-0.635) 92(28.575,0.635)
Top Overlay:
  lines w0.254: -29.083,-1.7 -29.4,-1.7 -29.4,1.7 -29.083,1.7 ; 29.083,-1.7 29.4,-1.7 29.4,1.7 29.083,1.7
Mechanical 13:
  lines w0.1: -29.21,-1.499 -29.21,1.501 ; -29.21,-1.499 29.21,-1.499 ; -29.21,-1.499 -29.21,1.501 ; -29.21,1.501 29.21,1.501 ; 29.21,-1.499 29.21,1.501 ; 29.21,-1.499 29.21,1.501
Mechanical 15:
  lines w0.2: -0.6,0 0.6,0 ; 0,-0.6 0,0.6 ; -29.4,-1.7 29.4,-1.7 29.4,1.7 -29.4,1.7 -29.4,-1.7
3D body: height 3.8, standoff -1.8, extent -29.21,-1.499 29.21,1.501

## CON127-47X2-DIP [mm] "1.27mm脚距47*2 双排针 -55°C to+105°C 450V AC"
height 3.5
pads (94):
  rect 0.85x0.85 hole 0.55 unplated: 1(-29.21,-0.635)
  round 0.85 hole 0.55 unplated: 2(-29.21,0.635) 3(-27.94,-0.635) 4(-27.94,0.635) 5(-26.67,-0.635) 6(-26.67,0.635) 7(-25.4,-0.635) 8(-25.4,0.635) 9(-24.13,-0.635) 10(-24.13,0.635) 11(-22.86,-0.635) 12(-22.86,0.635) 13(-21.59,-0.635) 14(-21.59,0.635) 15(-20.32,-0.635) 16(-20.32,0.635) 17(-19.05,-0.635) 18(-19.05,0.635) 19(-17.78,-0.635) 20(-17.78,0.635) 21(-16.51,-0.635) 22(-16.51,0.635) 23(-15.24,-0.635) 24(-15.24,0.635) 25(-13.97,-0.635) 26(-13.97,0.635) 27(-12.7,-0.635) 28(-12.7,0.635) 29(-11.43,-0.635) 30(-11.43,0.635) 31(-10.16,-0.635) 32(-10.16,0.635) 33(-8.89,-0.635) 34(-8.89,0.635) 35(-7.62,-0.635) 36(-7.62,0.635) 37(-6.35,-0.635) 38(-6.35,0.635) 39(-5.08,-0.635) 40(-5.08,0.635) 41(-3.81,-0.635) 42(-3.81,0.635) 43(-2.54,-0.635) 44(-2.54,0.635) 45(-1.27,-0.635) 46(-1.27,0.635) 47(0,-0.635) 48(0,0.635) 49(1.27,-0.635) 50(1.27,0.635) 51(2.54,-0.635) 52(2.54,0.635) 53(3.81,-0.635) 54(3.81,0.635) 55(5.08,-0.635) 56(5.08,0.635) 57(6.35,-0.635) 58(6.35,0.635) 59(7.62,-0.635) 60(7.62,0.635) 61(8.89,-0.635) 62(8.89,0.635) 63(10.16,-0.635) 64(10.16,0.635) 65(11.43,-0.635) 66(11.43,0.635) 67(12.7,-0.635) 68(12.7,0.635) 69(13.97,-0.635) 70(13.97,0.635) 71(15.24,-0.635) 72(15.24,0.635) 73(16.51,-0.635) 74(16.51,0.635) 75(17.78,-0.635) 76(17.78,0.635) 77(19.05,-0.635) 78(19.05,0.635) 79(20.32,-0.635) 80(20.32,0.635) 81(21.59,-0.635) 82(21.59,0.635) 83(22.86,-0.635) 84(22.86,0.635) 85(24.13,-0.635) 86(24.13,0.635) 87(25.4,-0.635) 88(25.4,0.635) 89(26.67,-0.635) 90(26.67,0.635) 91(27.94,-0.635) 92(27.94,0.635) 93(29.21,-0.635) 94(29.21,0.635)
Top Overlay:
  lines w0.254: -29.718,-1.7 -30.035,-1.7 -30.035,1.7 -29.718,1.7 ; 29.718,-1.7 30.035,-1.7 30.035,1.7 29.718,1.7
Mechanical 13:
  lines w0.1: -29.845,-1.499 29.845,-1.499 ; -29.845,-1.499 -29.845,1.501 ; -29.845,-1.499 -29.845,1.501 ; -29.845,1.501 29.845,1.501 ; 29.845,-1.499 29.845,1.501 ; 29.845,-1.499 29.845,1.501
Mechanical 15:
  lines w0.2: -0.6,0 0.6,0 ; 0,-0.6 0,0.6 ; -30.035,-1.7 30.035,-1.7 30.035,1.7 -30.035,1.7 -30.035,-1.7
3D body: height 3.8, standoff -1.8, extent -29.845,-1.499 29.845,1.501

## CON127-48X2-DIP [mm] "1.27mm脚距48*2 双排针 -55°C to+105°C 450V AC"
height 3.5
pads (96):
  rect 0.85x0.85 hole 0.55 unplated: 1(-29.845,-0.635)
  round 0.85 hole 0.55 unplated: 2(-29.845,0.635) 3(-28.575,-0.635) 4(-28.575,0.635) 5(-27.305,-0.635) 6(-27.305,0.635) 7(-26.035,-0.635) 8(-26.035,0.635) 9(-24.765,-0.635) 10(-24.765,0.635) 11(-23.495,-0.635) 12(-23.495,0.635) 13(-22.225,-0.635) 14(-22.225,0.635) 15(-20.955,-0.635) 16(-20.955,0.635) 17(-19.685,-0.635) 18(-19.685,0.635) 19(-18.415,-0.635) 20(-18.415,0.635) 21(-17.145,-0.635) 22(-17.145,0.635) 23(-15.875,-0.635) 24(-15.875,0.635) 25(-14.605,-0.635) 26(-14.605,0.635) 27(-13.335,-0.635) 28(-13.335,0.635) 29(-12.065,-0.635) 30(-12.065,0.635) 31(-10.795,-0.635) 32(-10.795,0.635) 33(-9.525,-0.635) 34(-9.525,0.635) 35(-8.255,-0.635) 36(-8.255,0.635) 37(-6.985,-0.635) 38(-6.985,0.635) 39(-5.715,-0.635) 40(-5.715,0.635) 41(-4.445,-0.635) 42(-4.445,0.635) 43(-3.175,-0.635) 44(-3.175,0.635) 45(-1.905,-0.635) 46(-1.905,0.635) 47(-0.635,-0.635) 48(-0.635,0.635) 49(0.635,-0.635) 50(0.635,0.635) 51(1.905,-0.635) 52(1.905,0.635) 53(3.175,-0.635) 54(3.175,0.635) 55(4.445,-0.635) 56(4.445,0.635) 57(5.715,-0.635) 58(5.715,0.635) 59(6.985,-0.635) 60(6.985,0.635) 61(8.255,-0.635) 62(8.255,0.635) 63(9.525,-0.635) 64(9.525,0.635) 65(10.795,-0.635) 66(10.795,0.635) 67(12.065,-0.635) 68(12.065,0.635) 69(13.335,-0.635) 70(13.335,0.635) 71(14.605,-0.635) 72(14.605,0.635) 73(15.875,-0.635) 74(15.875,0.635) 75(17.145,-0.635) 76(17.145,0.635) 77(18.415,-0.635) 78(18.415,0.635) 79(19.685,-0.635) 80(19.685,0.635) 81(20.955,-0.635) 82(20.955,0.635) 83(22.225,-0.635) 84(22.225,0.635) 85(23.495,-0.635) 86(23.495,0.635) 87(24.765,-0.635) 88(24.765,0.635) 89(26.035,-0.635) 90(26.035,0.635) 91(27.305,-0.635) 92(27.305,0.635) 93(28.575,-0.635) 94(28.575,0.635) 95(29.845,-0.635) 96(29.845,0.635)
Top Overlay:
  lines w0.254: -30.353,-1.7 -30.67,-1.7 -30.67,1.7 -30.353,1.7 ; 30.353,-1.7 30.67,-1.7 30.67,1.7 30.353,1.7
Mechanical 13:
  lines w0.1: -30.48,-1.499 -30.48,1.501 ; -30.48,-1.499 -30.48,1.501 ; -30.48,-1.499 30.48,-1.499 ; -30.48,1.501 30.48,1.501 ; 30.48,-1.499 30.48,1.501 ; 30.48,-1.499 30.48,1.501
Mechanical 15:
  lines w0.2: -0.6,0 0.6,0 ; 0,-0.6 0,0.6 ; -30.67,-1.7 -30.67,1.7 30.67,1.7 30.67,-1.7 -30.67,-1.7
3D body: height 3.8, standoff -1.8, extent -30.48,-1.499 30.48,1.501

## CON127-49X2-DIP [mm] "1.27mm脚距49*2 双排针 -55°C to+105°C 450V AC"
height 3.5
pads (98):
  rect 0.85x0.85 hole 0.55 unplated: 1(-30.48,-0.635)
  round 0.85 hole 0.55 unplated: 2(-30.48,0.635) 3(-29.21,-0.635) 4(-29.21,0.635) 5(-27.94,-0.635) 6(-27.94,0.635) 7(-26.67,-0.635) 8(-26.67,0.635) 9(-25.4,-0.635) 10(-25.4,0.635) 11(-24.13,-0.635) 12(-24.13,0.635) 13(-22.86,-0.635) 14(-22.86,0.635) 15(-21.59,-0.635) 16(-21.59,0.635) 17(-20.32,-0.635) 18(-20.32,0.635) 19(-19.05,-0.635) 20(-19.05,0.635) 21(-17.78,-0.635) 22(-17.78,0.635) 23(-16.51,-0.635) 24(-16.51,0.635) 25(-15.24,-0.635) 26(-15.24,0.635) 27(-13.97,-0.635) 28(-13.97,0.635) 29(-12.7,-0.635) 30(-12.7,0.635) 31(-11.43,-0.635) 32(-11.43,0.635) 33(-10.16,-0.635) 34(-10.16,0.635) 35(-8.89,-0.635) 36(-8.89,0.635) 37(-7.62,-0.635) 38(-7.62,0.635) 39(-6.35,-0.635) 40(-6.35,0.635) 41(-5.08,-0.635) 42(-5.08,0.635) 43(-3.81,-0.635) 44(-3.81,0.635) 45(-2.54,-0.635) 46(-2.54,0.635) 47(-1.27,-0.635) 48(-1.27,0.635) 49(0,-0.635) 50(0,0.635) 51(1.27,-0.635) 52(1.27,0.635) 53(2.54,-0.635) 54(2.54,0.635) 55(3.81,-0.635) 56(3.81,0.635) 57(5.08,-0.635) 58(5.08,0.635) 59(6.35,-0.635) 60(6.35,0.635) 61(7.62,-0.635) 62(7.62,0.635) 63(8.89,-0.635) 64(8.89,0.635) 65(10.16,-0.635) 66(10.16,0.635) 67(11.43,-0.635) 68(11.43,0.635) 69(12.7,-0.635) 70(12.7,0.635) 71(13.97,-0.635) 72(13.97,0.635) 73(15.24,-0.635) 74(15.24,0.635) 75(16.51,-0.635) 76(16.51,0.635) 77(17.78,-0.635) 78(17.78,0.635) 79(19.05,-0.635) 80(19.05,0.635) 81(20.32,-0.635) 82(20.32,0.635) 83(21.59,-0.635) 84(21.59,0.635) 85(22.86,-0.635) 86(22.86,0.635) 87(24.13,-0.635) 88(24.13,0.635) 89(25.4,-0.635) 90(25.4,0.635) 91(26.67,-0.635) 92(26.67,0.635) 93(27.94,-0.635) 94(27.94,0.635) 95(29.21,-0.635) 96(29.21,0.635) 97(30.48,-0.635) 98(30.48,0.635)
Top Overlay:
  lines w0.254: -30.988,-1.7 -31.305,-1.7 -31.305,1.7 -30.988,1.7 ; 30.988,-1.7 31.305,-1.7 31.305,1.7 30.988,1.7
Mechanical 13:
  lines w0.1: -31.115,-1.499 -31.115,1.501 ; -31.115,-1.499 31.115,-1.499 ; -31.115,-1.499 -31.115,1.501 ; -31.115,-1.499 31.115,-1.499 ; -31.115,1.501 31.115,1.501 ; -31.115,1.501 31.115,1.501 ; 31.115,-1.499 31.115,1.501 ; 31.115,-1.499 31.115,1.501
Mechanical 15:
  lines w0.2: -0.6,0 0.6,0 ; 0,-0.6 0,0.6 ; -31.305,-1.7 -31.305,1.7 31.305,1.7 31.305,-1.7 -31.305,-1.7
3D body: height 3.8, standoff -1.8, extent -31.115,-1.499 31.115,1.501